# Altium integrated library Lattice CPLD ispLSI.IntLib: 471 symbols (part 8 of 26)
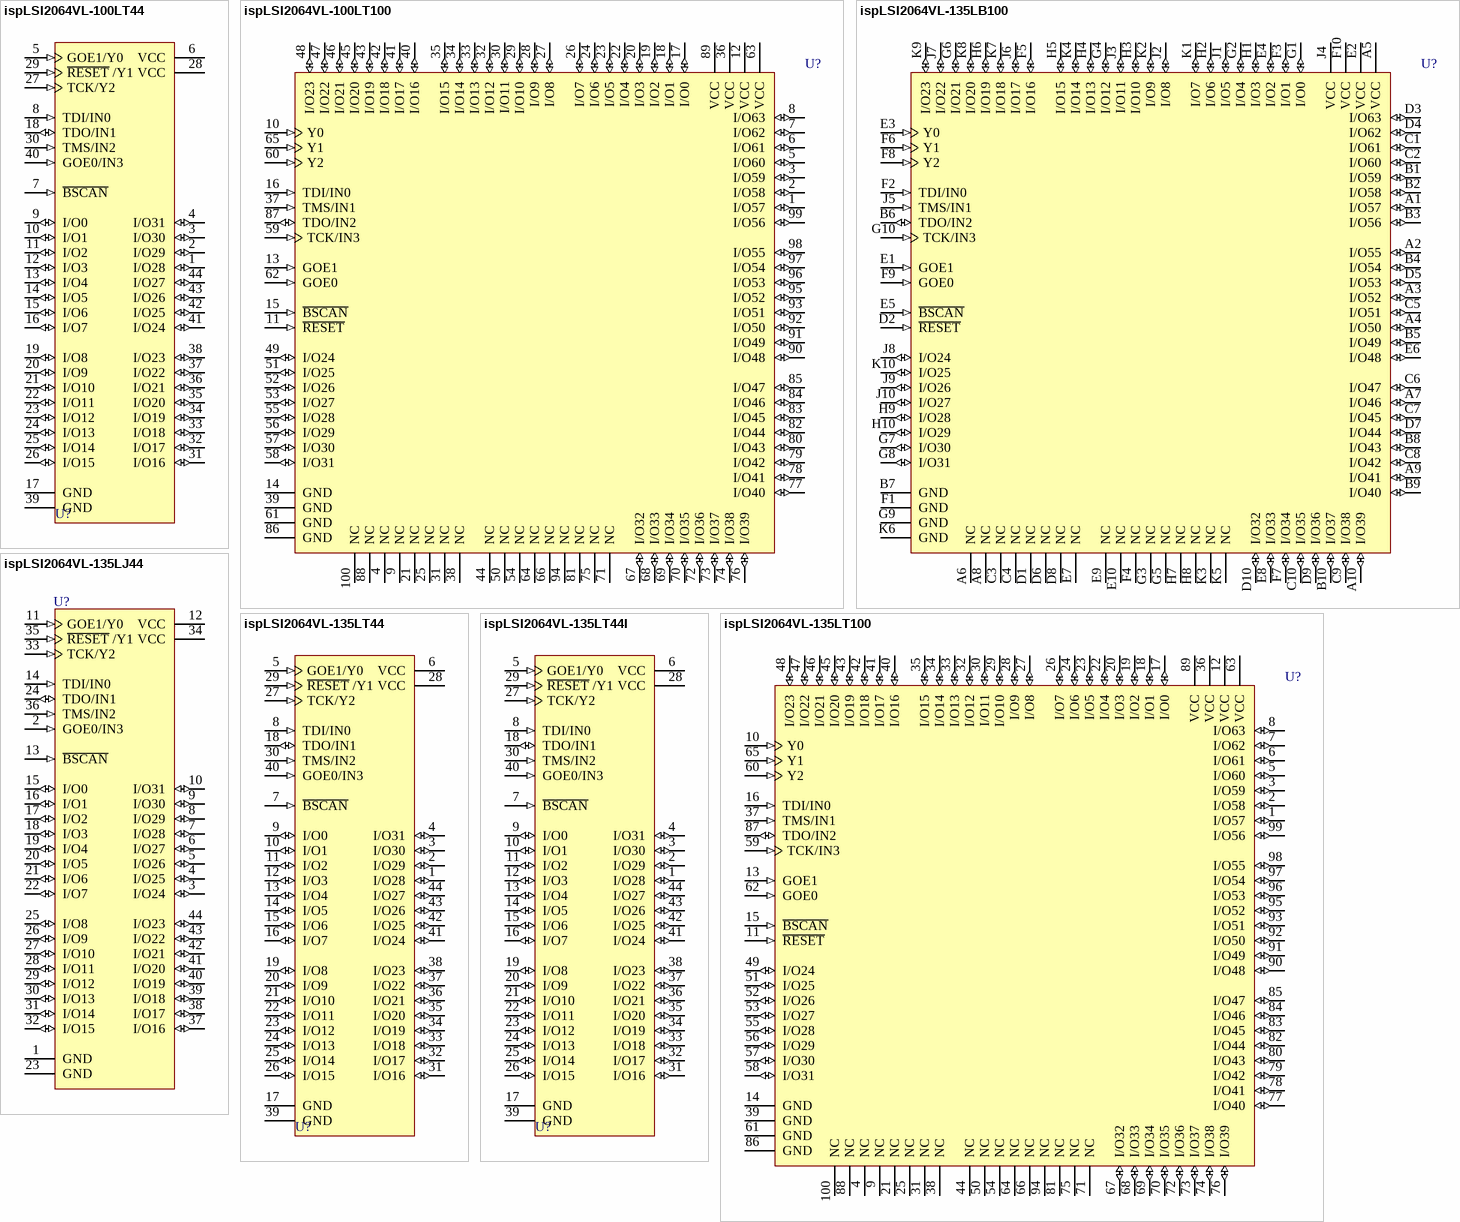
[diagram p238: symbols ispLSI2064VL-100LT44 to ispLSI2064VL-135LT100]

## ispLSI2064VL-100LT44
designator U?
2.5V In-System Programmable SuperFAST High Density PLD; Published: 17-Jul-2002; LatestRevisionDate: 13-Apr-2006; LatestRevisionNote: IPC-7351 Footprint Added.; DatasheetVersion: Sep-2000; PackageVersion: pkg_32, Aug-2005; PackageReference: TQFP44; Publisher: Altium Limited; PackageDescription: 44-Pin Thin Quad Flat Pack 0.8 mm Pitch; ComponentLink1Description: Manufacturer Link; ComponentLink1URL: http://www.latticesemi.com/products/mature/index.cfm; ComponentLink2Description: Datasheet; ComponentLink2URL: http://www.latticesemi.com/lit/docs/datasheets/cpld/2064vl.pdf
footprint TQFP44_N (Thin QFP, 44-Leads, Body 10x10mm, Pitch 0.8mm, IPC Medium Density)
footprint TQFP44_L (Thin QFP, 44-Leads, Body 10x10mm, Pitch 0.8mm, IPC High Density)
footprint TQFP44_M (Thin QFP, 44-Leads, Body 10x10mm, Pitch 0.8mm, IPC Low Density)
3D model 2064VL-TQFP44 (44-Pin Thin Quad Flat Pack 0.8 mm Pitch)
pins: 1 I/O28 (io), 2 I/O29 (io), 3 I/O30 (io), 4 I/O31 (io), 5 GOE1/Y0 (in), 6 VCC (power), 7 ~{BSCAN} (in), 8 TDI/IN0 (in), 9 I/O0 (io), 10 I/O1 (io), 11 I/O2 (io), 12 I/O3 (io), 13 I/O4 (io), 14 I/O5 (io), 15 I/O6 (io), 16 I/O7 (io), 17 GND (power), 18 TDO/IN1 (io), 19 I/O8 (io), 20 I/O9 (io), 21 I/O10 (io), 22 I/O11 (io), 23 I/O12 (io), 24 I/O13 (io), 25 I/O14 (io), 26 I/O15 (io), 27 TCK/Y2 (in), 28 VCC (power), 29 ~{RESET} /Y1 (in), 30 TMS/IN2 (in), 31 I/O16 (io), 32 I/O17 (io), 33 I/O18 (io), 34 I/O19 (io), 35 I/O20 (io), 36 I/O21 (io), 37 I/O22 (io), 38 I/O23 (io), 39 GND (power), 40 GOE0/IN3 (in), 41 I/O24 (io), 42 I/O25 (io), 43 I/O26 (io), 44 I/O27 (io)

## ispLSI2064VL-100LT100
designator U?
2.5V In-System Programmable SuperFAST High Density PLD; Published: 17-Jul-2002; LatestRevisionDate: 13-Apr-2006; LatestRevisionNote: IPC-7351 Footprint Added.; DatasheetVersion: Sep-2000; PackageVersion: pkg_32, Aug-2005; PackageReference: TQFP100; Publisher: Altium Limited; PackageDescription: 100-Pin Thin Quad Flat Pack (TQFP100); Code_JEDEC: MS-026-BED; ComponentLink1Description: Manufacturer Link; ComponentLink1URL: http://www.latticesemi.com/products/mature/index.cfm; ComponentLink2Description: Datasheet; ComponentLink2URL: http://www.latticesemi.com/lit/docs/datasheets/cpld/2064vl.pdf
footprint TQFP100_N (Thin QFP, 100-Leads, Body 14x14mm, Pitch 0.5mm, IPC Medium Density)
footprint TQFP100_L (Thin QFP, 100-Leads, Body 14x14mm, Pitch 0.5mm, IPC High Density)
footprint TQFP100_M (Thin QFP, 100-Leads, Body 14x14mm, Pitch 0.5mm, IPC Low Density)
3D model 2064VL-TQFP100 (100-Pin Thin Quad Flat Pack (TQFP100))
pins: 1 I/O57 (io), 2 I/O58 (io), 3 I/O59 (io), 4 NC, 5 I/O60 (io), 6 I/O61 (io), 7 I/O62 (io), 8 I/O63 (io), 9 NC, 10 Y0 (in), 11 ~{RESET} (in), 12 VCC (power), 13 GOE1 (in), 14 GND (power), 15 ~{BSCAN} (in), 16 TDI/IN0 (in), 17 I/O0 (io), 18 I/O1 (io), 19 I/O2 (io), 20 I/O3 (io), 21 NC, 22 I/O4 (io), 23 I/O5 (io), 24 I/O6 (io), 25 NC, 26 I/O7 (io), 27 I/O8 (io), 28 I/O9 (io), 29 I/O10 (io), 30 I/O11 (io), 31 NC, 32 I/O12 (io), 33 I/O13 (io), 34 I/O14 (io), 35 I/O15 (io), 36 VCC (power), 37 TMS/IN1 (in), 38 NC, 39 GND (power), 40 I/O16 (io), 41 I/O17 (io), 42 I/O18 (io), 43 I/O19 (io), 44 NC, 45 I/O20 (io), 46 I/O21 (io), 47 I/O22 (io), 48 I/O23 (io), 49 I/O24 (io), 50 NC, 51 I/O25 (io), 52 I/O26 (io), 53 I/O27 (io), 54 NC, 55 I/O28 (io), 56 I/O29 (io), 57 I/O30 (io), 58 I/O31 (io), 59 TCK/IN3 (in), 60 Y2 (in), 61 GND (power), 62 GOE0 (in), 63 VCC (power), 64 NC, 65 Y1 (in), 66 NC, 67 I/O32 (io), 68 I/O33 (io), 69 I/O34 (io), 70 I/O35 (io), 71 NC, 72 I/O36 (io), 73 I/O37 (io), 74 I/O38 (io), 75 NC, 76 I/O39 (io), 77 I/O40 (io), 78 I/O41 (io), 79 I/O42 (io), 80 I/O43 (io), 81 NC, 82 I/O44 (io), 83 I/O45 (io), 84 I/O46 (io), 85 I/O47 (io), 86 GND (power), 87 TDO/IN2 (io), 88 NC, 89 VCC (power), 90 I/O48 (io), 91 I/O49 (io), 92 I/O50 (io), 93 I/O51 (io), 94 NC, 95 I/O52 (io), 96 I/O53 (io), 97 I/O54 (io), 98 I/O55 (io), 99 I/O56 (io), 100 NC

## ispLSI2064VL-135LB100
designator U?
2.5V In-System Programmable SuperFAST High Density PLD; Published: 17-Jul-2002; LatestRevisionDate: 13-Apr-2006; LatestRevisionNote: IPC-7351 Footprint Added.; DatasheetVersion: Sep-2000; PackageVersion: pkg_32, Aug-2005; PackageReference: caBGA100; Publisher: Altium Limited; PackageDescription: 100-Ball Chip Array Ball Grid Array (caBGA100); ComponentLink1Description: Manufacturer Link; ComponentLink1URL: http://www.latticesemi.com/products/mature/index.cfm; ComponentLink2Description: Datasheet; ComponentLink2URL: http://www.latticesemi.com/lit/docs/datasheets/cpld/2064vl.pdf
footprint caBGA100 (BGA, 100-Leads, Body 10x10mm, Pitch 0.8mm)
3D model 2064VL-caBGA100 (100-Ball Chip Array Ball Grid Array (caBGA100))
pins: A1 I/O57 (io), A2 I/O55 (io), A3 I/O52 (io), A4 I/O50 (io), A5 VCC (power), A6 NC, A7 I/O46 (io), A8 NC, A9 I/O41 (io), A10 I/O39 (io), B1 I/O59 (io), B2 I/O58 (io), B3 I/O56 (io), B4 I/O54 (io), B5 I/O49 (io), B6 TDO/IN2 (io), B7 GND (power), B8 I/O43 (io), B9 I/O40 (io), B10 I/O37 (io), C1 I/O61 (io), C2 I/O60 (io), C3 NC, C4 NC, C5 I/O51 (io), C6 I/O47 (io), C7 I/O45 (io), C8 I/O42 (io), C9 I/O38 (io), C10 I/O35 (io), D1 NC, D2 ~{RESET} (in), D3 I/O63 (io), D4 I/O62 (io), D5 I/O53 (io), D6 NC, D7 I/O44 (io), D8 NC, D9 I/O36 (io), D10 I/O32 (io), E1 GOE1 (in), E2 VCC (power), E3 Y0 (in), E4 I/O2 (io), E5 ~{BSCAN} (in), E6 I/O48 (io), E7 NC, E8 I/O33 (io), E9 NC, E10 NC, F1 GND (power), F2 TDI/IN0 (in), F3 I/O1 (io), F4 NC, F5 I/O16 (io), F6 Y1 (in), F7 I/O34 (io), F8 Y2 (in), F9 GOE0 (in), F10 VCC (power), G1 I/O0 (io), G2 I/O4 (io), G3 NC, G4 I/O12 (io), G5 NC, G6 I/O21 (io), G7 I/O30 (io), G8 I/O31 (io), G9 GND (power), G10 TCK/IN3 (in), H1 I/O3 (io), H2 I/O6 (io), H3 I/O10 (io), H4 I/O13 (io), H5 I/O15 (io), H6 I/O19 (io), H7 NC, H8 NC, H9 I/O28 (io), H10 I/O29 (io), J1 I/O5 (io), J2 I/O8 (io), J3 I/O11 (io), J4 VCC (power), J5 TMS/IN1 (in), J6 I/O17 (io), J7 I/O22 (io), J8 I/O24 (io), J9 I/O26 (io), J10 I/O27 (io), K1 I/O7 (io), K2 I/O9 (io), K3 NC, K4 I/O14 (io), K5 NC, K6 GND (power), K7 I/O18 (io), K8 I/O20 (io), K9 I/O23 (io), K10 I/O25 (io)

## ispLSI2064VL-135LJ44
designator U?
2.5V In-System Programmable SuperFAST High Density PLD; Published: 17-Jul-2002; LatestRevisionDate: 13-Apr-2006; LatestRevisionNote: IPC-7351 Footprint Added.; DatasheetVersion: Sep-2000; PackageVersion: pkg_32, Aug-2005; PackageReference: PLCC44; Publisher: Altium Limited; PackageDescription: 44-Pin Leaded Chip Carrier 1.27 mm Pitch; Code_IPC: PLCC-44; ComponentLink1Description: Manufacturer Link; ComponentLink1URL: http://www.latticesemi.com/products/mature/index.cfm; ComponentLink2Description: Datasheet; ComponentLink2URL: http://www.latticesemi.com/lit/docs/datasheets/cpld/2064vl.pdf
footprint PLCC44_N (Leaded Chip Carrier, 44-Leads, Body 16.6x16.6mm, Pitch 1.27mm, IPC Medium Density)
footprint PLCC44_L (Leaded Chip Carrier, 44-Leads, Body 16.6x16.6mm, Pitch 1.27mm, IPC High Density)
footprint PLCC44_M (Leaded Chip Carrier, 44-Leads, Body 16.6x16.6mm, Pitch 1.27mm, IPC Low Density)
3D model 2064VL-PLCC44 (44-Pin Leaded Chip Carrier 1.27 mm Pitch)
pins: 1 GND (power), 2 GOE0/IN3 (in), 3 I/O24 (io), 4 I/O25 (io), 5 I/O26 (io), 6 I/O27 (io), 7 I/O28 (io), 8 I/O29 (io), 9 I/O30 (io), 10 I/O31 (io), 11 GOE1/Y0 (in), 12 VCC (power), 13 ~{BSCAN} (in), 14 TDI/IN0 (in), 15 I/O0 (io), 16 I/O1 (io), 17 I/O2 (io), 18 I/O3 (io), 19 I/O4 (io), 20 I/O5 (io), 21 I/O6 (io), 22 I/O7 (io), 23 GND (power), 24 TDO/IN1 (io), 25 I/O8 (io), 26 I/O9 (io), 27 I/O10 (io), 28 I/O11 (io), 29 I/O12 (io), 30 I/O13 (io), 31 I/O14 (io), 32 I/O15 (io), 33 TCK/Y2 (in), 34 VCC (power), 35 ~{RESET} /Y1 (in), 36 TMS/IN2 (in), 37 I/O16 (io), 38 I/O17 (io), 39 I/O18 (io), 40 I/O19 (io), 41 I/O20 (io), 42 I/O21 (io), 43 I/O22 (io), 44 I/O23 (io)

## ispLSI2064VL-135LT44
designator U?
2.5V In-System Programmable SuperFAST High Density PLD; Published: 17-Jul-2002; LatestRevisionDate: 13-Apr-2006; LatestRevisionNote: IPC-7351 Footprint Added.; DatasheetVersion: Sep-2000; PackageVersion: pkg_32, Aug-2005; PackageReference: TQFP44; Publisher: Altium Limited; PackageDescription: 44-Pin Thin Quad Flat Pack 0.8 mm Pitch; ComponentLink1Description: Manufacturer Link; ComponentLink1URL: http://www.latticesemi.com/products/mature/index.cfm; ComponentLink2Description: Datasheet; ComponentLink2URL: http://www.latticesemi.com/lit/docs/datasheets/cpld/2064vl.pdf
footprint TQFP44_N (Thin QFP, 44-Leads, Body 10x10mm, Pitch 0.8mm, IPC Medium Density)
footprint TQFP44_L (Thin QFP, 44-Leads, Body 10x10mm, Pitch 0.8mm, IPC High Density)
footprint TQFP44_M (Thin QFP, 44-Leads, Body 10x10mm, Pitch 0.8mm, IPC Low Density)
3D model 2064VL-TQFP44 (44-Pin Thin Quad Flat Pack 0.8 mm Pitch)
pins: 1 I/O28 (io), 2 I/O29 (io), 3 I/O30 (io), 4 I/O31 (io), 5 GOE1/Y0 (in), 6 VCC (power), 7 ~{BSCAN} (in), 8 TDI/IN0 (in), 9 I/O0 (io), 10 I/O1 (io), 11 I/O2 (io), 12 I/O3 (io), 13 I/O4 (io), 14 I/O5 (io), 15 I/O6 (io), 16 I/O7 (io), 17 GND (power), 18 TDO/IN1 (io), 19 I/O8 (io), 20 I/O9 (io), 21 I/O10 (io), 22 I/O11 (io), 23 I/O12 (io), 24 I/O13 (io), 25 I/O14 (io), 26 I/O15 (io), 27 TCK/Y2 (in), 28 VCC (power), 29 ~{RESET} /Y1 (in), 30 TMS/IN2 (in), 31 I/O16 (io), 32 I/O17 (io), 33 I/O18 (io), 34 I/O19 (io), 35 I/O20 (io), 36 I/O21 (io), 37 I/O22 (io), 38 I/O23 (io), 39 GND (power), 40 GOE0/IN3 (in), 41 I/O24 (io), 42 I/O25 (io), 43 I/O26 (io), 44 I/O27 (io)

## ispLSI2064VL-135LT44I
designator U?
2.5V In-System Programmable SuperFAST High Density PLD; Published: 17-Jul-2002; LatestRevisionDate: 13-Apr-2006; LatestRevisionNote: IPC-7351 Footprint Added.; DatasheetVersion: Sep-2000; PackageVersion: pkg_32, Aug-2005; PackageReference: TQFP44; Publisher: Altium Limited; PackageDescription: 44-Pin Thin Quad Flat Pack 0.8 mm Pitch; ComponentLink1Description: Manufacturer Link; ComponentLink1URL: http://www.latticesemi.com/products/mature/index.cfm; ComponentLink2Description: Datasheet; ComponentLink2URL: http://www.latticesemi.com/lit/docs/datasheets/cpld/2064vl.pdf
footprint TQFP44_N (Thin QFP, 44-Leads, Body 10x10mm, Pitch 0.8mm, IPC Medium Density)
footprint TQFP44_L (Thin QFP, 44-Leads, Body 10x10mm, Pitch 0.8mm, IPC High Density)
footprint TQFP44_M (Thin QFP, 44-Leads, Body 10x10mm, Pitch 0.8mm, IPC Low Density)
3D model 2064VL-TQFP44 (44-Pin Thin Quad Flat Pack 0.8 mm Pitch)
pins: 1 I/O28 (io), 2 I/O29 (io), 3 I/O30 (io), 4 I/O31 (io), 5 GOE1/Y0 (in), 6 VCC (power), 7 ~{BSCAN} (in), 8 TDI/IN0 (in), 9 I/O0 (io), 10 I/O1 (io), 11 I/O2 (io), 12 I/O3 (io), 13 I/O4 (io), 14 I/O5 (io), 15 I/O6 (io), 16 I/O7 (io), 17 GND (power), 18 TDO/IN1 (io), 19 I/O8 (io), 20 I/O9 (io), 21 I/O10 (io), 22 I/O11 (io), 23 I/O12 (io), 24 I/O13 (io), 25 I/O14 (io), 26 I/O15 (io), 27 TCK/Y2 (in), 28 VCC (power), 29 ~{RESET} /Y1 (in), 30 TMS/IN2 (in), 31 I/O16 (io), 32 I/O17 (io), 33 I/O18 (io), 34 I/O19 (io), 35 I/O20 (io), 36 I/O21 (io), 37 I/O22 (io), 38 I/O23 (io), 39 GND (power), 40 GOE0/IN3 (in), 41 I/O24 (io), 42 I/O25 (io), 43 I/O26 (io), 44 I/O27 (io)

## ispLSI2064VL-135LT100
designator U?
2.5V In-System Programmable SuperFAST High Density PLD; Published: 17-Jul-2002; LatestRevisionDate: 13-Apr-2006; LatestRevisionNote: IPC-7351 Footprint Added.; DatasheetVersion: Sep-2000; PackageVersion: pkg_32, Aug-2005; PackageReference: TQFP100; Publisher: Altium Limited; PackageDescription: 100-Pin Thin Quad Flat Pack (TQFP100); Code_JEDEC: MS-026-BED; ComponentLink1Description: Manufacturer Link; ComponentLink1URL: http://www.latticesemi.com/products/mature/index.cfm; ComponentLink2Description: Datasheet; ComponentLink2URL: http://www.latticesemi.com/lit/docs/datasheets/cpld/2064vl.pdf
footprint TQFP100_N (Thin QFP, 100-Leads, Body 14x14mm, Pitch 0.5mm, IPC Medium Density)
footprint TQFP100_L (Thin QFP, 100-Leads, Body 14x14mm, Pitch 0.5mm, IPC High Density)
footprint TQFP100_M (Thin QFP, 100-Leads, Body 14x14mm, Pitch 0.5mm, IPC Low Density)
3D model 2064VL-TQFP100 (100-Pin Thin Quad Flat Pack (TQFP100))
pins: 1 I/O57 (io), 2 I/O58 (io), 3 I/O59 (io), 4 NC, 5 I/O60 (io), 6 I/O61 (io), 7 I/O62 (io), 8 I/O63 (io), 9 NC, 10 Y0 (in), 11 ~{RESET} (in), 12 VCC (power), 13 GOE1 (in), 14 GND (power), 15 ~{BSCAN} (in), 16 TDI/IN0 (in), 17 I/O0 (io), 18 I/O1 (io), 19 I/O2 (io), 20 I/O3 (io), 21 NC, 22 I/O4 (io), 23 I/O5 (io), 24 I/O6 (io), 25 NC, 26 I/O7 (io), 27 I/O8 (io), 28 I/O9 (io), 29 I/O10 (io), 30 I/O11 (io), 31 NC, 32 I/O12 (io), 33 I/O13 (io), 34 I/O14 (io), 35 I/O15 (io), 36 VCC (power), 37 TMS/IN1 (in), 38 NC, 39 GND (power), 40 I/O16 (io), 41 I/O17 (io), 42 I/O18 (io), 43 I/O19 (io), 44 NC, 45 I/O20 (io), 46 I/O21 (io), 47 I/O22 (io), 48 I/O23 (io), 49 I/O24 (io), 50 NC, 51 I/O25 (io), 52 I/O26 (io), 53 I/O27 (io), 54 NC, 55 I/O28 (io), 56 I/O29 (io), 57 I/O30 (io), 58 I/O31 (io), 59 TCK/IN3 (in), 60 Y2 (in), 61 GND (power), 62 GOE0 (in), 63 VCC (power), 64 NC, 65 Y1 (in), 66 NC, 67 I/O32 (io), 68 I/O33 (io), 69 I/O34 (io), 70 I/O35 (io), 71 NC, 72 I/O36 (io), 73 I/O37 (io), 74 I/O38 (io), 75 NC, 76 I/O39 (io), 77 I/O40 (io), 78 I/O41 (io), 79 I/O42 (io), 80 I/O43 (io), 81 NC, 82 I/O44 (io), 83 I/O45 (io), 84 I/O46 (io), 85 I/O47 (io), 86 GND (power), 87 TDO/IN2 (io), 88 NC, 89 VCC (power), 90 I/O48 (io), 91 I/O49 (io), 92 I/O50 (io), 93 I/O51 (io), 94 NC, 95 I/O52 (io), 96 I/O53 (io), 97 I/O54 (io), 98 I/O55 (io), 99 I/O56 (io), 100 NC

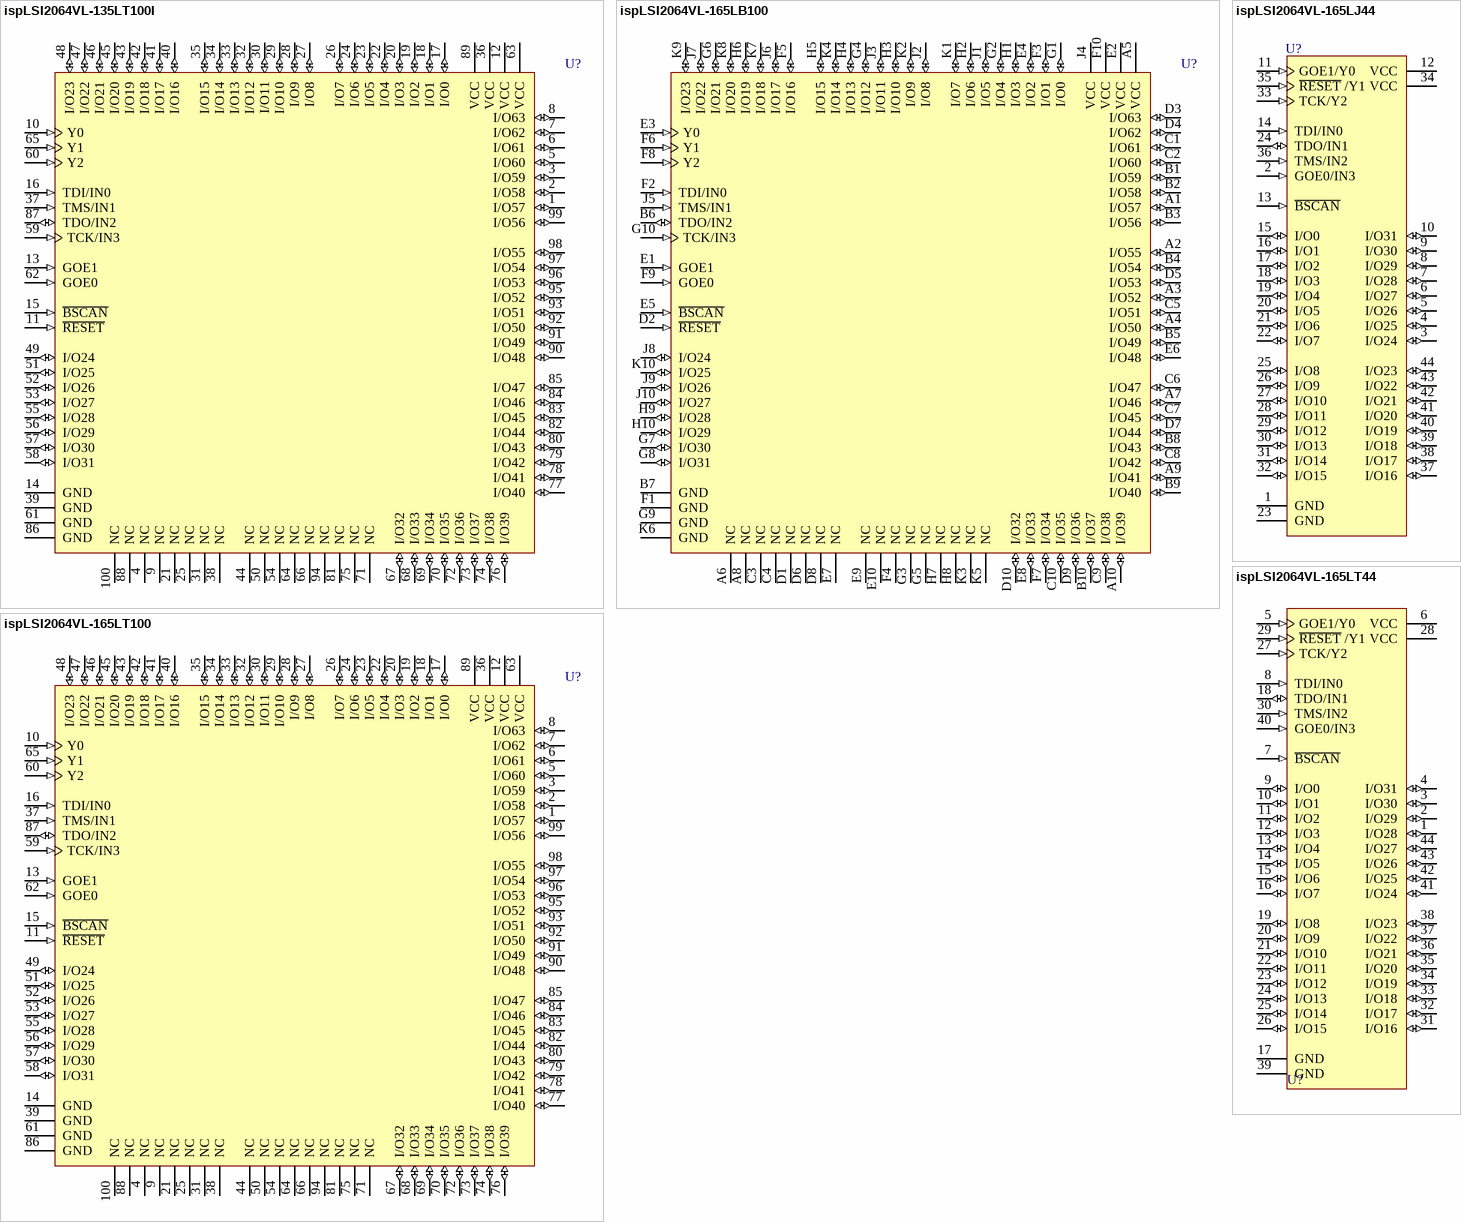
[diagram p51: symbols ispLSI2064VL-135LT100I to ispLSI2064VL-165LT100]

## ispLSI2064VL-135LT100I
designator U?
2.5V In-System Programmable SuperFAST High Density PLD; Published: 17-Jul-2002; LatestRevisionDate: 13-Apr-2006; LatestRevisionNote: IPC-7351 Footprint Added.; DatasheetVersion: Sep-2000; PackageVersion: pkg_32, Aug-2005; PackageReference: TQFP100; Publisher: Altium Limited; PackageDescription: 100-Pin Thin Quad Flat Pack (TQFP100); Code_JEDEC: MS-026-BED; ComponentLink1Description: Manufacturer Link; ComponentLink1URL: http://www.latticesemi.com/products/mature/index.cfm; ComponentLink2Description: Datasheet; ComponentLink2URL: http://www.latticesemi.com/lit/docs/datasheets/cpld/2064vl.pdf
footprint TQFP100_N (Thin QFP, 100-Leads, Body 14x14mm, Pitch 0.5mm, IPC Medium Density)
footprint TQFP100_L (Thin QFP, 100-Leads, Body 14x14mm, Pitch 0.5mm, IPC High Density)
footprint TQFP100_M (Thin QFP, 100-Leads, Body 14x14mm, Pitch 0.5mm, IPC Low Density)
3D model 2064VL-TQFP100 (100-Pin Thin Quad Flat Pack (TQFP100))
pins: 1 I/O57 (io), 2 I/O58 (io), 3 I/O59 (io), 4 NC, 5 I/O60 (io), 6 I/O61 (io), 7 I/O62 (io), 8 I/O63 (io), 9 NC, 10 Y0 (in), 11 ~{RESET} (in), 12 VCC (power), 13 GOE1 (in), 14 GND (power), 15 ~{BSCAN} (in), 16 TDI/IN0 (in), 17 I/O0 (io), 18 I/O1 (io), 19 I/O2 (io), 20 I/O3 (io), 21 NC, 22 I/O4 (io), 23 I/O5 (io), 24 I/O6 (io), 25 NC, 26 I/O7 (io), 27 I/O8 (io), 28 I/O9 (io), 29 I/O10 (io), 30 I/O11 (io), 31 NC, 32 I/O12 (io), 33 I/O13 (io), 34 I/O14 (io), 35 I/O15 (io), 36 VCC (power), 37 TMS/IN1 (in), 38 NC, 39 GND (power), 40 I/O16 (io), 41 I/O17 (io), 42 I/O18 (io), 43 I/O19 (io), 44 NC, 45 I/O20 (io), 46 I/O21 (io), 47 I/O22 (io), 48 I/O23 (io), 49 I/O24 (io), 50 NC, 51 I/O25 (io), 52 I/O26 (io), 53 I/O27 (io), 54 NC, 55 I/O28 (io), 56 I/O29 (io), 57 I/O30 (io), 58 I/O31 (io), 59 TCK/IN3 (in), 60 Y2 (in), 61 GND (power), 62 GOE0 (in), 63 VCC (power), 64 NC, 65 Y1 (in), 66 NC, 67 I/O32 (io), 68 I/O33 (io), 69 I/O34 (io), 70 I/O35 (io), 71 NC, 72 I/O36 (io), 73 I/O37 (io), 74 I/O38 (io), 75 NC, 76 I/O39 (io), 77 I/O40 (io), 78 I/O41 (io), 79 I/O42 (io), 80 I/O43 (io), 81 NC, 82 I/O44 (io), 83 I/O45 (io), 84 I/O46 (io), 85 I/O47 (io), 86 GND (power), 87 TDO/IN2 (io), 88 NC, 89 VCC (power), 90 I/O48 (io), 91 I/O49 (io), 92 I/O50 (io), 93 I/O51 (io), 94 NC, 95 I/O52 (io), 96 I/O53 (io), 97 I/O54 (io), 98 I/O55 (io), 99 I/O56 (io), 100 NC

## ispLSI2064VL-165LB100
designator U?
2.5V In-System Programmable SuperFAST High Density PLD; Published: 17-Jul-2002; LatestRevisionDate: 13-Apr-2006; LatestRevisionNote: IPC-7351 Footprint Added.; DatasheetVersion: Sep-2000; PackageVersion: pkg_32, Aug-2005; PackageReference: caBGA100; Publisher: Altium Limited; PackageDescription: 100-Ball Chip Array Ball Grid Array (caBGA100); ComponentLink1Description: Manufacturer Link; ComponentLink1URL: http://www.latticesemi.com/products/mature/index.cfm; ComponentLink2Description: Datasheet; ComponentLink2URL: http://www.latticesemi.com/lit/docs/datasheets/cpld/2064vl.pdf
footprint caBGA100 (BGA, 100-Leads, Body 10x10mm, Pitch 0.8mm)
3D model 2064VL-caBGA100 (100-Ball Chip Array Ball Grid Array (caBGA100))
pins: A1 I/O57 (io), A2 I/O55 (io), A3 I/O52 (io), A4 I/O50 (io), A5 VCC (power), A6 NC, A7 I/O46 (io), A8 NC, A9 I/O41 (io), A10 I/O39 (io), B1 I/O59 (io), B2 I/O58 (io), B3 I/O56 (io), B4 I/O54 (io), B5 I/O49 (io), B6 TDO/IN2 (io), B7 GND (power), B8 I/O43 (io), B9 I/O40 (io), B10 I/O37 (io), C1 I/O61 (io), C2 I/O60 (io), C3 NC, C4 NC, C5 I/O51 (io), C6 I/O47 (io), C7 I/O45 (io), C8 I/O42 (io), C9 I/O38 (io), C10 I/O35 (io), D1 NC, D2 ~{RESET} (in), D3 I/O63 (io), D4 I/O62 (io), D5 I/O53 (io), D6 NC, D7 I/O44 (io), D8 NC, D9 I/O36 (io), D10 I/O32 (io), E1 GOE1 (in), E2 VCC (power), E3 Y0 (in), E4 I/O2 (io), E5 ~{BSCAN} (in), E6 I/O48 (io), E7 NC, E8 I/O33 (io), E9 NC, E10 NC, F1 GND (power), F2 TDI/IN0 (in), F3 I/O1 (io), F4 NC, F5 I/O16 (io), F6 Y1 (in), F7 I/O34 (io), F8 Y2 (in), F9 GOE0 (in), F10 VCC (power), G1 I/O0 (io), G2 I/O4 (io), G3 NC, G4 I/O12 (io), G5 NC, G6 I/O21 (io), G7 I/O30 (io), G8 I/O31 (io), G9 GND (power), G10 TCK/IN3 (in), H1 I/O3 (io), H2 I/O6 (io), H3 I/O10 (io), H4 I/O13 (io), H5 I/O15 (io), H6 I/O19 (io), H7 NC, H8 NC, H9 I/O28 (io), H10 I/O29 (io), J1 I/O5 (io), J2 I/O8 (io), J3 I/O11 (io), J4 VCC (power), J5 TMS/IN1 (in), J6 I/O17 (io), J7 I/O22 (io), J8 I/O24 (io), J9 I/O26 (io), J10 I/O27 (io), K1 I/O7 (io), K2 I/O9 (io), K3 NC, K4 I/O14 (io), K5 NC, K6 GND (power), K7 I/O18 (io), K8 I/O20 (io), K9 I/O23 (io), K10 I/O25 (io)

## ispLSI2064VL-165LJ44
designator U?
2.5V In-System Programmable SuperFAST High Density PLD; Published: 17-Jul-2002; LatestRevisionDate: 13-Apr-2006; LatestRevisionNote: IPC-7351 Footprint Added.; DatasheetVersion: Sep-2000; PackageVersion: pkg_32, Aug-2005; PackageReference: PLCC44; Publisher: Altium Limited; PackageDescription: 44-Pin Leaded Chip Carrier 1.27 mm Pitch; Code_IPC: PLCC-44; ComponentLink1Description: Manufacturer Link; ComponentLink1URL: http://www.latticesemi.com/products/mature/index.cfm; ComponentLink2Description: Datasheet; ComponentLink2URL: http://www.latticesemi.com/lit/docs/datasheets/cpld/2064vl.pdf
footprint PLCC44_N (Leaded Chip Carrier, 44-Leads, Body 16.6x16.6mm, Pitch 1.27mm, IPC Medium Density)
footprint PLCC44_L (Leaded Chip Carrier, 44-Leads, Body 16.6x16.6mm, Pitch 1.27mm, IPC High Density)
footprint PLCC44_M (Leaded Chip Carrier, 44-Leads, Body 16.6x16.6mm, Pitch 1.27mm, IPC Low Density)
3D model 2064VL-PLCC44 (44-Pin Leaded Chip Carrier 1.27 mm Pitch)
pins: 1 GND (power), 2 GOE0/IN3 (in), 3 I/O24 (io), 4 I/O25 (io), 5 I/O26 (io), 6 I/O27 (io), 7 I/O28 (io), 8 I/O29 (io), 9 I/O30 (io), 10 I/O31 (io), 11 GOE1/Y0 (in), 12 VCC (power), 13 ~{BSCAN} (in), 14 TDI/IN0 (in), 15 I/O0 (io), 16 I/O1 (io), 17 I/O2 (io), 18 I/O3 (io), 19 I/O4 (io), 20 I/O5 (io), 21 I/O6 (io), 22 I/O7 (io), 23 GND (power), 24 TDO/IN1 (io), 25 I/O8 (io), 26 I/O9 (io), 27 I/O10 (io), 28 I/O11 (io), 29 I/O12 (io), 30 I/O13 (io), 31 I/O14 (io), 32 I/O15 (io), 33 TCK/Y2 (in), 34 VCC (power), 35 ~{RESET} /Y1 (in), 36 TMS/IN2 (in), 37 I/O16 (io), 38 I/O17 (io), 39 I/O18 (io), 40 I/O19 (io), 41 I/O20 (io), 42 I/O21 (io), 43 I/O22 (io), 44 I/O23 (io)

## ispLSI2064VL-165LT44
designator U?
2.5V In-System Programmable SuperFAST High Density PLD; Published: 17-Jul-2002; LatestRevisionDate: 13-Apr-2006; LatestRevisionNote: IPC-7351 Footprint Added.; DatasheetVersion: Sep-2000; PackageVersion: pkg_32, Aug-2005; PackageReference: TQFP44; Publisher: Altium Limited; PackageDescription: 44-Pin Thin Quad Flat Pack 0.8 mm Pitch; ComponentLink1Description: Manufacturer Link; ComponentLink1URL: http://www.latticesemi.com/products/mature/index.cfm; ComponentLink2Description: Datasheet; ComponentLink2URL: http://www.latticesemi.com/lit/docs/datasheets/cpld/2064vl.pdf
footprint TQFP44_N (Thin QFP, 44-Leads, Body 10x10mm, Pitch 0.8mm, IPC Medium Density)
footprint TQFP44_L (Thin QFP, 44-Leads, Body 10x10mm, Pitch 0.8mm, IPC High Density)
footprint TQFP44_M (Thin QFP, 44-Leads, Body 10x10mm, Pitch 0.8mm, IPC Low Density)
3D model 2064VL-TQFP44 (44-Pin Thin Quad Flat Pack 0.8 mm Pitch)
pins: 1 I/O28 (io), 2 I/O29 (io), 3 I/O30 (io), 4 I/O31 (io), 5 GOE1/Y0 (in), 6 VCC (power), 7 ~{BSCAN} (in), 8 TDI/IN0 (in), 9 I/O0 (io), 10 I/O1 (io), 11 I/O2 (io), 12 I/O3 (io), 13 I/O4 (io), 14 I/O5 (io), 15 I/O6 (io), 16 I/O7 (io), 17 GND (power), 18 TDO/IN1 (io), 19 I/O8 (io), 20 I/O9 (io), 21 I/O10 (io), 22 I/O11 (io), 23 I/O12 (io), 24 I/O13 (io), 25 I/O14 (io), 26 I/O15 (io), 27 TCK/Y2 (in), 28 VCC (power), 29 ~{RESET} /Y1 (in), 30 TMS/IN2 (in), 31 I/O16 (io), 32 I/O17 (io), 33 I/O18 (io), 34 I/O19 (io), 35 I/O20 (io), 36 I/O21 (io), 37 I/O22 (io), 38 I/O23 (io), 39 GND (power), 40 GOE0/IN3 (in), 41 I/O24 (io), 42 I/O25 (io), 43 I/O26 (io), 44 I/O27 (io)

## ispLSI2064VL-165LT100
designator U?
2.5V In-System Programmable SuperFAST High Density PLD; Published: 17-Jul-2002; LatestRevisionDate: 13-Apr-2006; LatestRevisionNote: IPC-7351 Footprint Added.; DatasheetVersion: Sep-2000; PackageVersion: pkg_32, Aug-2005; PackageReference: TQFP100; Publisher: Altium Limited; PackageDescription: 100-Pin Thin Quad Flat Pack (TQFP100); Code_JEDEC: MS-026-BED; ComponentLink1Description: Manufacturer Link; ComponentLink1URL: http://www.latticesemi.com/products/mature/index.cfm; ComponentLink2Description: Datasheet; ComponentLink2URL: http://www.latticesemi.com/lit/docs/datasheets/cpld/2064vl.pdf
footprint TQFP100_N (Thin QFP, 100-Leads, Body 14x14mm, Pitch 0.5mm, IPC Medium Density)
footprint TQFP100_L (Thin QFP, 100-Leads, Body 14x14mm, Pitch 0.5mm, IPC High Density)
footprint TQFP100_M (Thin QFP, 100-Leads, Body 14x14mm, Pitch 0.5mm, IPC Low Density)
3D model 2064VL-TQFP100 (100-Pin Thin Quad Flat Pack (TQFP100))
pins: 1 I/O57 (io), 2 I/O58 (io), 3 I/O59 (io), 4 NC, 5 I/O60 (io), 6 I/O61 (io), 7 I/O62 (io), 8 I/O63 (io), 9 NC, 10 Y0 (in), 11 ~{RESET} (in), 12 VCC (power), 13 GOE1 (in), 14 GND (power), 15 ~{BSCAN} (in), 16 TDI/IN0 (in), 17 I/O0 (io), 18 I/O1 (io), 19 I/O2 (io), 20 I/O3 (io), 21 NC, 22 I/O4 (io), 23 I/O5 (io), 24 I/O6 (io), 25 NC, 26 I/O7 (io), 27 I/O8 (io), 28 I/O9 (io), 29 I/O10 (io), 30 I/O11 (io), 31 NC, 32 I/O12 (io), 33 I/O13 (io), 34 I/O14 (io), 35 I/O15 (io), 36 VCC (power), 37 TMS/IN1 (in), 38 NC, 39 GND (power), 40 I/O16 (io), 41 I/O17 (io), 42 I/O18 (io), 43 I/O19 (io), 44 NC, 45 I/O20 (io), 46 I/O21 (io), 47 I/O22 (io), 48 I/O23 (io), 49 I/O24 (io), 50 NC, 51 I/O25 (io), 52 I/O26 (io), 53 I/O27 (io), 54 NC, 55 I/O28 (io), 56 I/O29 (io), 57 I/O30 (io), 58 I/O31 (io), 59 TCK/IN3 (in), 60 Y2 (in), 61 GND (power), 62 GOE0 (in), 63 VCC (power), 64 NC, 65 Y1 (in), 66 NC, 67 I/O32 (io), 68 I/O33 (io), 69 I/O34 (io), 70 I/O35 (io), 71 NC, 72 I/O36 (io), 73 I/O37 (io), 74 I/O38 (io), 75 NC, 76 I/O39 (io), 77 I/O40 (io), 78 I/O41 (io), 79 I/O42 (io), 80 I/O43 (io), 81 NC, 82 I/O44 (io), 83 I/O45 (io), 84 I/O46 (io), 85 I/O47 (io), 86 GND (power), 87 TDO/IN2 (io), 88 NC, 89 VCC (power), 90 I/O48 (io), 91 I/O49 (io), 92 I/O50 (io), 93 I/O51 (io), 94 NC, 95 I/O52 (io), 96 I/O53 (io), 97 I/O54 (io), 98 I/O55 (io), 99 I/O56 (io), 100 NC

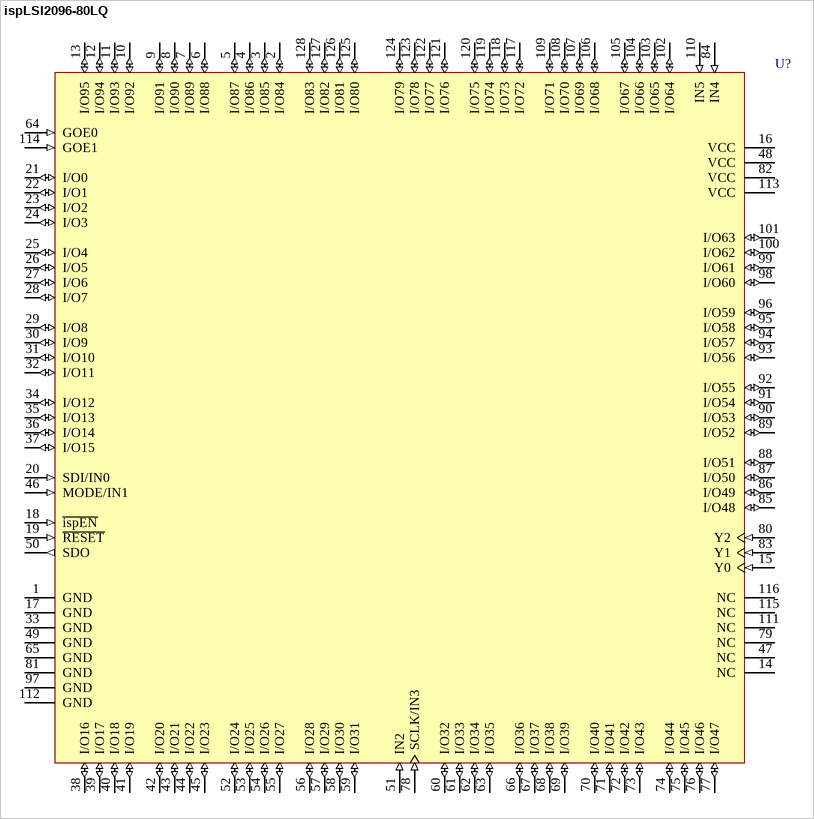
[diagram p52: symbol ispLSI2096-80LQ]

## ispLSI2096-80LQ
designator U?
In-System Programmable High-Density PLD; Note: Pins 20, 46 and 78 have dual function capability.; Published: 23-Sep-2002; LatestRevisionDate: 13-Apr-2006; LatestRevisionNote: IPC-7351 Footprint Added.; DatasheetVersion: Feb-2000; PackageVersion: pkg_32, Aug-2005; PackageReference: PQFP128; Publisher: Altium Limited; PackageDescription: 128-Pin Quad Flat Pack 0.8 mm Pitch; Code_IPC: QFP80P3120X3120-128; ComponentLink1Description: Manufacturer Link; ComponentLink1URL: http://www.latticesemi.com/products/mature/index.cfm; ComponentLink2Description: Datasheet; ComponentLink2URL: http://www.latticesemi.com/lit/docs/datasheets/cpld/2096.pdf
footprint PQFP128_N (QFP, 128-Leads, Body 28x28mm, Pitch 0.8mm, IPC Medium Density)
footprint PQFP128_L (QFP, 128-Leads, Body 28x28mm, Pitch 0.8mm, IPC High Density)
footprint PQFP128_M (QFP, 128-Leads, Body 28x28mm, Pitch 0.8mm, IPC Low Density)
3D model 2096-PQFP128 (128-Pin Quad Flat Pack 0.8 mm Pitch)
pins: 1 GND (power), 2 I/O84 (io), 3 I/O85 (io), 4 I/O86 (io), 5 I/O87 (io), 6 I/O88 (io), 7 I/O89 (io), 8 I/O90 (io), 9 I/O91 (io), 10 I/O92 (io), 11 I/O93 (io), 12 I/O94 (io), 13 I/O95 (io), 14 NC, 15 Y0 (in), 16 VCC (power), 17 GND (power), 18 ~{ispEN} (in), 19 ~{RESET} (in), 20 SDI/IN0 (in), 21 I/O0 (io), 22 I/O1 (io), 23 I/O2 (io), 24 I/O3 (io), 25 I/O4 (io), 26 I/O5 (io), 27 I/O6 (io), 28 I/O7 (io), 29 I/O8 (io), 30 I/O9 (io), 31 I/O10 (io), 32 I/O11 (io), 33 GND (power), 34 I/O12 (io), 35 I/O13 (io), 36 I/O14 (io), 37 I/O15 (io), 38 I/O16 (io), 39 I/O17 (io), 40 I/O18 (io), 41 I/O19 (io), 42 I/O20 (io), 43 I/O21 (io), 44 I/O22 (io), 45 I/O23 (io), 46 MODE/IN1 (in), 47 NC, 48 VCC (power), 49 GND (power), 50 SDO (out), 51 IN2 (in), 52 I/O24 (io), 53 I/O25 (io), 54 I/O26 (io), 55 I/O27 (io), 56 I/O28 (io), 57 I/O29 (io), 58 I/O30 (io), 59 I/O31 (io), 60 I/O32 (io), 61 I/O33 (io), 62 I/O34 (io), 63 I/O35 (io), 64 GOE0 (in), 65 GND (power), 66 I/O36 (io), 67 I/O37 (io), 68 I/O38 (io), 69 I/O39 (io), 70 I/O40 (io), 71 I/O41 (io), 72 I/O42 (io), 73 I/O43 (io), 74 I/O44 (io), 75 I/O45 (io), 76 I/O46 (io), 77 I/O47 (io), 78 SCLK/IN3 (in), 79 NC, 80 Y2 (in), 81 GND (power), 82 VCC (power), 83 Y1 (in), 84 IN4 (in), 85 I/O48 (io), 86 I/O49 (io), 87 I/O50 (io), 88 I/O51 (io), 89 I/O52 (io), 90 I/O53 (io), 91 I/O54 (io), 92 I/O55 (io), 93 I/O56 (io), 94 I/O57 (io), 95 I/O58 (io), 96 I/O59 (io), 97 GND (power), 98 I/O60 (io), 99 I/O61 (io), 100 I/O62 (io), 101 I/O63 (io), 102 I/O64 (io), 103 I/O65 (io), 104 I/O66 (io), 105 I/O67 (io), 106 I/O68 (io), 107 I/O69 (io), 108 I/O70 (io), 109 I/O71 (io), 110 IN5 (in), 111 NC, 112 GND (power), 113 VCC (power), 114 GOE1 (in), 115 NC, 116 NC, 117 I/O72 (io), 118 I/O73 (io), 119 I/O74 (io), 120 I/O75 (io), 121 I/O76 (io), 122 I/O77 (io), 123 I/O78 (io), 124 I/O79 (io), 125 I/O80 (io), 126 I/O81 (io), 127 I/O82 (io), 128 I/O83 (io)

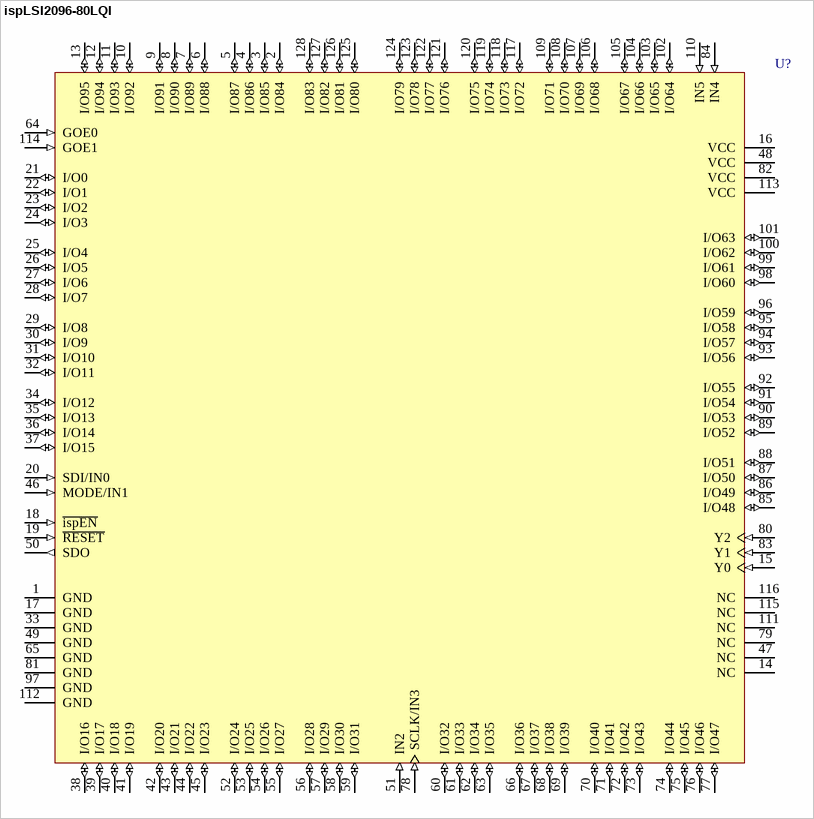
[diagram p53: symbol ispLSI2096-80LQI]

## ispLSI2096-80LQI
designator U?
In-System Programmable High-Density PLD; Note: Pins 20, 46 and 78 have dual function capability.; Published: 23-Sep-2002; LatestRevisionDate: 13-Apr-2006; LatestRevisionNote: IPC-7351 Footprint Added.; DatasheetVersion: Feb-2000; PackageVersion: pkg_32, Aug-2005; PackageReference: PQFP128; Publisher: Altium Limited; PackageDescription: 128-Pin Quad Flat Pack 0.8 mm Pitch; Code_IPC: QFP80P3120X3120-128; ComponentLink1Description: Manufacturer Link; ComponentLink1URL: http://www.latticesemi.com/products/mature/index.cfm; ComponentLink2Description: Datasheet; ComponentLink2URL: http://www.latticesemi.com/lit/docs/datasheets/cpld/2096.pdf
footprint PQFP128_N (QFP, 128-Leads, Body 28x28mm, Pitch 0.8mm, IPC Medium Density)
footprint PQFP128_L (QFP, 128-Leads, Body 28x28mm, Pitch 0.8mm, IPC High Density)
footprint PQFP128_M (QFP, 128-Leads, Body 28x28mm, Pitch 0.8mm, IPC Low Density)
3D model 2096-PQFP128 (128-Pin Quad Flat Pack 0.8 mm Pitch)
pins: 1 GND (power), 2 I/O84 (io), 3 I/O85 (io), 4 I/O86 (io), 5 I/O87 (io), 6 I/O88 (io), 7 I/O89 (io), 8 I/O90 (io), 9 I/O91 (io), 10 I/O92 (io), 11 I/O93 (io), 12 I/O94 (io), 13 I/O95 (io), 14 NC, 15 Y0 (in), 16 VCC (power), 17 GND (power), 18 ~{ispEN} (in), 19 ~{RESET} (in), 20 SDI/IN0 (in), 21 I/O0 (io), 22 I/O1 (io), 23 I/O2 (io), 24 I/O3 (io), 25 I/O4 (io), 26 I/O5 (io), 27 I/O6 (io), 28 I/O7 (io), 29 I/O8 (io), 30 I/O9 (io), 31 I/O10 (io), 32 I/O11 (io), 33 GND (power), 34 I/O12 (io), 35 I/O13 (io), 36 I/O14 (io), 37 I/O15 (io), 38 I/O16 (io), 39 I/O17 (io), 40 I/O18 (io), 41 I/O19 (io), 42 I/O20 (io), 43 I/O21 (io), 44 I/O22 (io), 45 I/O23 (io), 46 MODE/IN1 (in), 47 NC, 48 VCC (power), 49 GND (power), 50 SDO (out), 51 IN2 (in), 52 I/O24 (io), 53 I/O25 (io), 54 I/O26 (io), 55 I/O27 (io), 56 I/O28 (io), 57 I/O29 (io), 58 I/O30 (io), 59 I/O31 (io), 60 I/O32 (io), 61 I/O33 (io), 62 I/O34 (io), 63 I/O35 (io), 64 GOE0 (in), 65 GND (power), 66 I/O36 (io), 67 I/O37 (io), 68 I/O38 (io), 69 I/O39 (io), 70 I/O40 (io), 71 I/O41 (io), 72 I/O42 (io), 73 I/O43 (io), 74 I/O44 (io), 75 I/O45 (io), 76 I/O46 (io), 77 I/O47 (io), 78 SCLK/IN3 (in), 79 NC, 80 Y2 (in), 81 GND (power), 82 VCC (power), 83 Y1 (in), 84 IN4 (in), 85 I/O48 (io), 86 I/O49 (io), 87 I/O50 (io), 88 I/O51 (io), 89 I/O52 (io), 90 I/O53 (io), 91 I/O54 (io), 92 I/O55 (io), 93 I/O56 (io), 94 I/O57 (io), 95 I/O58 (io), 96 I/O59 (io), 97 GND (power), 98 I/O60 (io), 99 I/O61 (io), 100 I/O62 (io), 101 I/O63 (io), 102 I/O64 (io), 103 I/O65 (io), 104 I/O66 (io), 105 I/O67 (io), 106 I/O68 (io), 107 I/O69 (io), 108 I/O70 (io), 109 I/O71 (io), 110 IN5 (in), 111 NC, 112 GND (power), 113 VCC (power), 114 GOE1 (in), 115 NC, 116 NC, 117 I/O72 (io), 118 I/O73 (io), 119 I/O74 (io), 120 I/O75 (io), 121 I/O76 (io), 122 I/O77 (io), 123 I/O78 (io), 124 I/O79 (io), 125 I/O80 (io), 126 I/O81 (io), 127 I/O82 (io), 128 I/O83 (io)

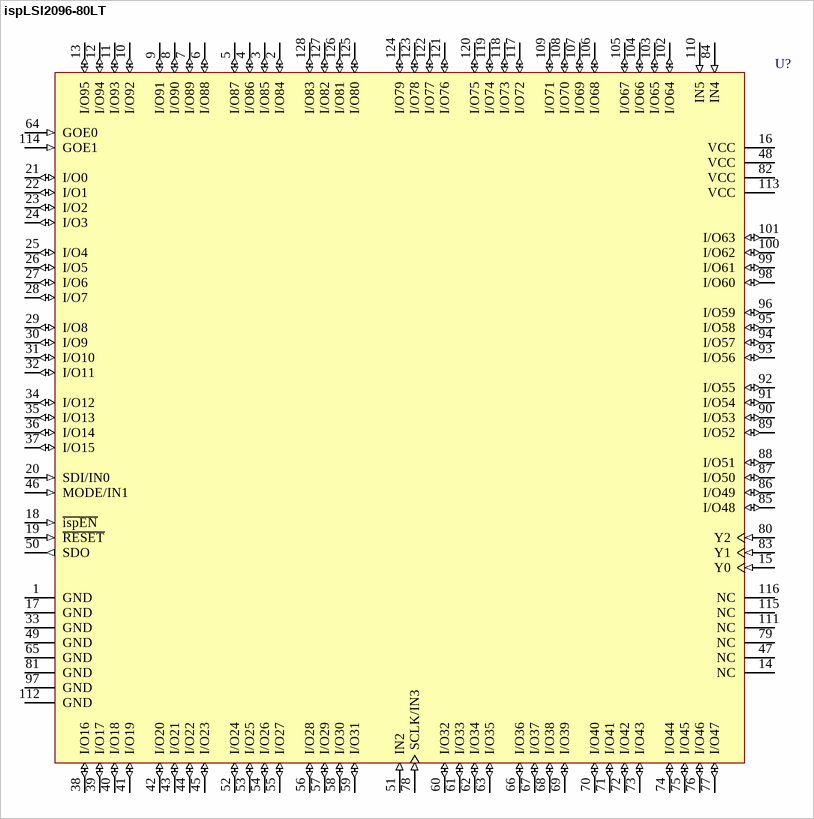
[diagram p54: symbol ispLSI2096-80LT]

## ispLSI2096-80LT
designator U?
In-System Programmable High-Density PLD; Note: Pins 20, 46 and 78 have dual function capability.; Published: 23-Sep-2002; LatestRevisionDate: 13-Apr-2006; LatestRevisionNote: IPC-7351 Footprint Added.; DatasheetVersion: Feb-2000; PackageVersion: Aug-2005; PackageReference: TQFP128; Publisher: Altium Limited; PackageDescription: 128-Pin Thin Quad Flat Pack 0.4 mm Pitch; ComponentLink1Description: Manufacturer Link; ComponentLink1URL: http://www.latticesemi.com/products/mature/index.cfm; ComponentLink2Description: Datasheet; ComponentLink2URL: http://www.latticesemi.com/lit/docs/datasheets/cpld/2096.pdf
footprint TQFP128_N (Thin QFP, 128-Leads, Body 14x14mm, Pitch 0.4mm, IPC Medium Density)
footprint TQFP128_L (Thin QFP, 128-Leads, Body 14x14mm, Pitch 0.4mm, IPC High Density)
footprint TQFP128_M (Thin QFP, 128-Leads, Body 14x14mm, Pitch 0.4mm, IPC Low Density)
3D model 2096-TQFP128 (128-Pin Thin Quad Flat Pack 0.4 mm Pitch)
pins: 1 GND (power), 2 I/O84 (io), 3 I/O85 (io), 4 I/O86 (io), 5 I/O87 (io), 6 I/O88 (io), 7 I/O89 (io), 8 I/O90 (io), 9 I/O91 (io), 10 I/O92 (io), 11 I/O93 (io), 12 I/O94 (io), 13 I/O95 (io), 14 NC, 15 Y0 (in), 16 VCC (power), 17 GND (power), 18 ~{ispEN} (in), 19 ~{RESET} (in), 20 SDI/IN0 (in), 21 I/O0 (io), 22 I/O1 (io), 23 I/O2 (io), 24 I/O3 (io), 25 I/O4 (io), 26 I/O5 (io), 27 I/O6 (io), 28 I/O7 (io), 29 I/O8 (io), 30 I/O9 (io), 31 I/O10 (io), 32 I/O11 (io), 33 GND (power), 34 I/O12 (io), 35 I/O13 (io), 36 I/O14 (io), 37 I/O15 (io), 38 I/O16 (io), 39 I/O17 (io), 40 I/O18 (io), 41 I/O19 (io), 42 I/O20 (io), 43 I/O21 (io), 44 I/O22 (io), 45 I/O23 (io), 46 MODE/IN1 (in), 47 NC, 48 VCC (power), 49 GND (power), 50 SDO (out), 51 IN2 (in), 52 I/O24 (io), 53 I/O25 (io), 54 I/O26 (io), 55 I/O27 (io), 56 I/O28 (io), 57 I/O29 (io), 58 I/O30 (io), 59 I/O31 (io), 60 I/O32 (io), 61 I/O33 (io), 62 I/O34 (io), 63 I/O35 (io), 64 GOE0 (in), 65 GND (power), 66 I/O36 (io), 67 I/O37 (io), 68 I/O38 (io), 69 I/O39 (io), 70 I/O40 (io), 71 I/O41 (io), 72 I/O42 (io), 73 I/O43 (io), 74 I/O44 (io), 75 I/O45 (io), 76 I/O46 (io), 77 I/O47 (io), 78 SCLK/IN3 (in), 79 NC, 80 Y2 (in), 81 GND (power), 82 VCC (power), 83 Y1 (in), 84 IN4 (in), 85 I/O48 (io), 86 I/O49 (io), 87 I/O50 (io), 88 I/O51 (io), 89 I/O52 (io), 90 I/O53 (io), 91 I/O54 (io), 92 I/O55 (io), 93 I/O56 (io), 94 I/O57 (io), 95 I/O58 (io), 96 I/O59 (io), 97 GND (power), 98 I/O60 (io), 99 I/O61 (io), 100 I/O62 (io), 101 I/O63 (io), 102 I/O64 (io), 103 I/O65 (io), 104 I/O66 (io), 105 I/O67 (io), 106 I/O68 (io), 107 I/O69 (io), 108 I/O70 (io), 109 I/O71 (io), 110 IN5 (in), 111 NC, 112 GND (power), 113 VCC (power), 114 GOE1 (in), 115 NC, 116 NC, 117 I/O72 (io), 118 I/O73 (io), 119 I/O74 (io), 120 I/O75 (io), 121 I/O76 (io), 122 I/O77 (io), 123 I/O78 (io), 124 I/O79 (io), 125 I/O80 (io), 126 I/O81 (io), 127 I/O82 (io), 128 I/O83 (io)

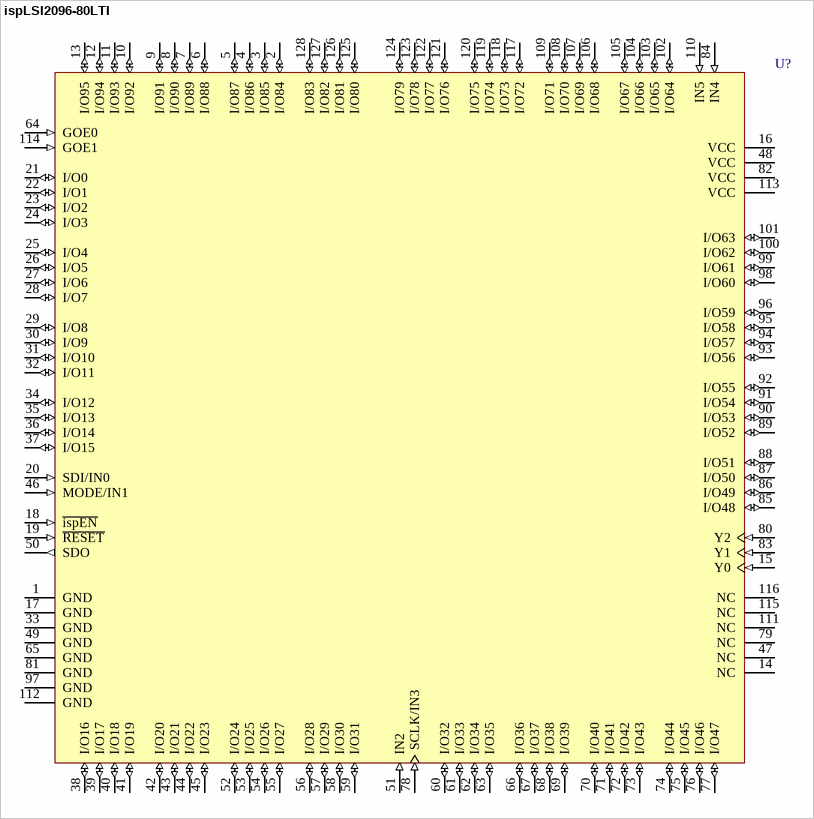
[diagram p55: symbol ispLSI2096-80LTI]
